# Altium footprint library 7.Connectors&Battary_holders.PcbLib: 133 footprints (part 3 of 9)
Each footprint in its own frame and in the unit in brackets; x right, y up, seen from the top. Pads: shape width x height; smd on the part's side, far side on the other; paste and mask are expansions set on the pad; w line width, h text height; cw(c..) or ccw(c..) is an arc to the next point about the centre after c.
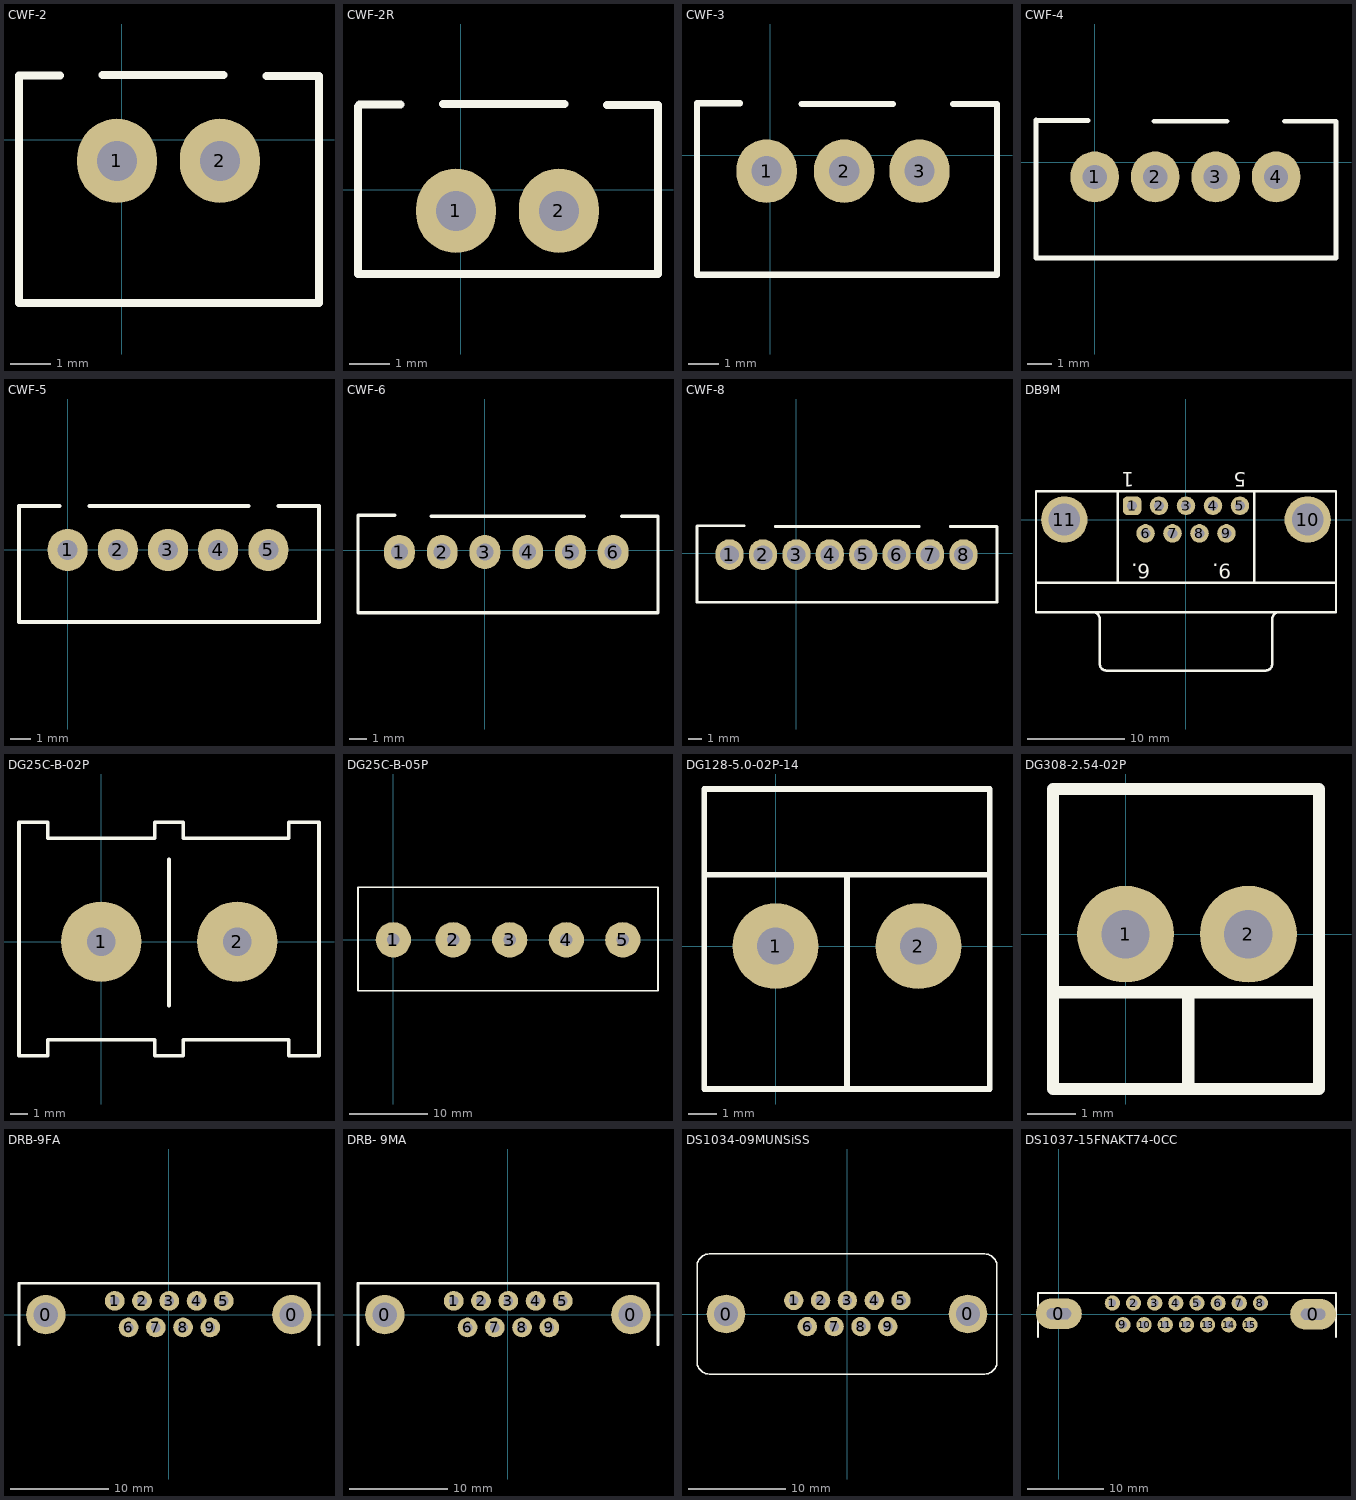
[diagram p2: the footprints below, top view; thin cyan lines are the x and y axes]

## CWF-2 [mm]
pads (2):
  oval 2x2.1 hole 1: 1(-0.123,-0.52) 2(2.445,-0.52)
Top Overlay:
  lines w0.2: -1.544,1.61 -2.569,1.61 -2.569,-4.07 4.918,-4.07 4.918,1.601 3.609,1.601 ; -0.485,1.623 2.54,1.623
3D body "User Library-DS1069-2 CWF-2.step": height 7, standoff -3.5, extent -2.582,-4.144 4.918,1.606

## CWF-2R [mm]
pads (2):
  oval 2x2.1 hole 1: 1(-0.123,-0.52) 2(2.445,-0.52)
Top Overlay:
  lines w0.2: -1.502,2.13 -2.528,2.13 -2.569,2.089 -2.569,-2.095 4.918,-2.095 4.918,2.121 3.651,2.121 ; -0.444,2.143 2.581,2.143
3D body "User Library-DS1069-2 MR (CWF-2 R).STEP": height 5.85, standoff -3.3, extent -2.485,-0.805 4.915,6.835

## CWF-3 [mm]
pads (3):
  oval 2x2.1 hole 1: 1(-0.123,-0.52) 2(2.445,-0.52) 3(4.936,-0.52)
Top Overlay:
  lines w0.2: -1.006,1.725 -2.422,1.725 -2.425,1.721 -2.425,-3.95 7.5,-3.95 7.5,1.7 6.04,1.7 ; 1.035,1.694 4.06,1.694
3D body "User Library-CWF-3.step": height 7, standoff -3.5, extent -2.567,-4.036 7.433,1.714

## CWF-4 [mm]
pads (4):
  oval 2x2.1 hole 1: 1(0,-0.6) 2(2.5,-0.6) 3(5,-0.6) 4(7.5,-0.6)
Top Overlay:
  lines w0.2: -2.425,1.75 -2.425,-3.95 9.975,-3.95 9.975,1.65 ; -2.4,1.725 -0.275,1.725 ; 2.45,1.7 5.475,1.7 ; 7.85,1.7 9.975,1.7
3D body "User Library-CWF-4.step": height 7, standoff -3.5, extent -2.3,-4.175 10.1,1.575

## CWF-5 [mm]
pads (5):
  oval 2x2.1 hole 1: 1(0,0) 2(2.5,0) 3(5,0) 4(7.5,0) 5(10,0)
Top Overlay:
  lines w0.2: -0.4,2.2 -2.425,2.2 -2.425,-3.6 12.525,-3.6 12.525,2.2 10.5,2.2 ; 1.1,2.2 9,2.2
3D body "User Library-CWF-5.step": height 7, standoff -3.5, extent -2.5,-3.55 12.5,2.2

## CWF-6 [mm]
pads (6):
  oval 1.8x2 hole 1: 1(-5,-0.1) 2(-2.5,-0.1) 3(0,-0.1) 4(2.5,-0.1) 5(5,-0.1) 6(7.5,-0.1)
Top Overlay:
  lines w0.2: -7.425,2.025 -7.425,-3.65 10.125,-3.65 10.125,1.95 ; -7.4,2.05 -5.275,2.05 ; -3.15,2 5.825,2 ; 8,2 10.125,2
3D body "User Library-CWF-6.step": height 3.5, standoff -7, extent -7.35,-3.775 10.15,1.975

## CWF-8 [mm]
pads (8):
  oval 2.1x2.3 hole 1.4: 1(-5,-0.1) 2(-2.5,-0.1) 3(0,-0.1) 4(2.5,-0.1) 5(5,-0.1) 6(7.5,-0.1) 7(10,-0.1) 8(12.5,-0.1)
Top Overlay:
  lines w0.2: -7.425,2.025 -7.425,-3.65 15,-3.65 15,2 11.5,2 ; -7.4,2.05 -3.9,2.05 ; -1.575,2 9.2,2
3D body "User Library-CWF-8.step": height 2.5, standoff -8, extent -7.55,-3.65 14.95,2.1

## DB9M [mm] "Connector; D Subminiature; 9 Position; Right Angle; Pitch 1.385 mm"
height 12.75
pads (11):
  rrect50% 1.905x1.905 hole 1: 1(-5.54,1.42)
  round 1.905 hole 1: 2(-2.77,1.42) 3(0,1.42) 4(2.77,1.42) 5(5.54,1.42) 6(-4.155,-1.42) 7(-1.385,-1.42) 8(1.385,-1.42) 9(4.155,-1.42)
  round 4.76 hole 3.26: 10(12.495,0) 11(-12.495,0)
Top Overlay:
  lines w0.254: -15.4,-6.5 15.4,-6.5 ; -9.56,-9.505 cw(c-9.56,-10.2) -8.865,-10.2 -8.865,-14.8 ; -8.86,-14.805 ccw(c-8.165,-14.805) -8.165,-15.5 8.165,-15.5 ccw(c8.165,-14.805) 8.86,-14.805 ; -7,-6.5 -7,2.9 ; 7,-6.5 7,2.9 ; 8.865,-14.8 8.865,-10.2 cw(c9.56,-10.2) 9.56,-9.505 ; -15.4,-9.5 -15.4,2.9 15.4,2.9 15.4,-9.5 -15.4,-9.5
  text "5" at 6.171,4.875 h1.5
  text "1" at -5.294,4.875 h1.5
  text "6." at -3.655,-4.525 h1.5
  text "9." at 4.655,-4.525 h1.5
3D body "D-SUB9 Male.STEP": height 12.57, standoff -3.15, extent -15.469,-16.231 15.418,3.454

## DG25C-B-02P [mm]
pads (2):
  round 4.5 hole 1.6: 1(0,0) 2(7.62,0)
Top Overlay:
  lines w0.2: 3.8,-3.6 3.8,4.6 ; -4.6,-6.4 -4.6,6.7 -3,6.7 -3,5.8 3,5.8 3,6.7 4.6,6.7 4.6,5.8 10.5,5.8 10.5,6.7 12.2,6.7 12.2,-6.4 10.5,-6.4 10.5,-5.5 4.6,-5.5 4.6,-6.4 3,-6.4 3,-5.5 -3,-5.5 -3,-6.4 -4.6,-6.4
3D body "User Library-DG25C-1.STEP": height 15, standoff -4.59, extent -4.57,-6.484 12.17,6.75

## DG25C-B-05P [mm]
pads (5):
  round 4.5 hole 1.6: 1(0,0) 2(7.62,0) 3(14.82,0) 4(22.02,0) 5(29.22,0)
Top Overlay:
  lines w0.2: -4.5,-6.5 33.7,-6.5 33.7,6.7 -4.5,6.7 -4.5,-6.5
3D body "User Library-DG25C-1.STEP": height 15, standoff -4.59, extent -4.57,-6.484 12.17,6.75
3D body "User Library-DG25C-1.STEP": height 15, standoff -4.59, extent 17.03,-6.484 33.77,6.75
3D body "User Library-DG25C-1.STEP": height 15, standoff -4.59, extent 9.83,-6.484 26.57,6.75

## DG128-5.0-02P-14 [mm]
pads (2):
  round 3 hole 1.3: 1(0,0) 2(5,0)
Top Overlay:
  lines w0.2: -2.5,2.5 7.5,2.5 ; 2.5,-5 2.5,2.5 ; 5.5,5.5 7.5,5.5 ; 7.5,5.5 -2.5,5.5 -2.5,-5 7.5,-5 7.5,5.5
3D body "User Library-klema-5mm-2pin.step": height 14, standoff -4, extent -2.5,-5 7.5,5.5

## DG308-2.54-02P [mm]
pads (2):
  round 2 hole 1: 1(0,0) 2(2.54,0)
Top Overlay:
  lines w0.254: -1.5,-1.2 4,-1.2 ; 1.295,-3.15 1.295,-1.219 ; -1.5,-3.2 4,-3.2 4,3 -1.5,3 -1.5,-3.2
3D body "User Library-DG308-2.step": height 7.93, standoff -3.9, extent -1.65,-2.997 4.15,3.025

## DRB-9FA [mm]
pads (11):
  round 4 hole 2.5: 0(-12.5,0) 0(12.5,0)
  round 2 hole 1: 1(-5.5,1.4) 2(-2.73,1.4) 3(0.04,1.4) 4(2.81,1.4) 5(5.58,1.4) 6(-4.1,-1.3) 7(-1.33,-1.3) 8(1.44,-1.3) 9(4.21,-1.3)
Top Overlay:
  lines w0.254: -15.225,-3.05 -15.225,3.175 15.25,3.175 15.25,-3.05
3D body "User Library-DB-9F.step": height 12.25, standoff -4.15, extent -15.25,-13.5 15.25,3.2

## DRB- 9MA [mm]
pads (11):
  round 4 hole 2.5: 0(-12.5,0) 0(12.5,0)
  round 2 hole 1: 1(-5.5,1.4) 2(-2.73,1.4) 3(0.04,1.4) 4(2.81,1.4) 5(5.58,1.4) 6(-4.1,-1.3) 7(-1.33,-1.3) 8(1.44,-1.3) 9(4.21,-1.3)
Top Overlay:
  lines w0.254: -15.225,-3.05 -15.225,3.175 15.25,3.175 15.25,-3.05
3D body "User Library-43767.STEP": height 12.55, standoff -3.95, extent -15.4,-15.475 15.4,3.025

## DS1034-09MUNSiSS [mm]
pads (11):
  round 4 hole 2.5: 0(-12.5,0) 0(12.5,0)
  round 2 hole 1: 1(-5.5,1.4) 2(-2.73,1.4) 3(0.04,1.4) 4(2.81,1.4) 5(5.58,1.4) 6(-4.1,-1.3) 7(-1.33,-1.3) 8(1.44,-1.3) 9(4.21,-1.3)
Top Overlay:
  lines w0.15: -15.5,-4.93 ccw(c-14.23,-4.93) -14.23,-6.2 14.23,-6.2 ccw(c14.23,-4.93) 15.5,-4.93 15.5,4.93 ccw(c14.23,4.93) 14.23,6.2 -14.23,6.2 ccw(c-14.23,4.93) -15.5,4.93 -15.5,-4 -15.5,-4.93
3D body "User Library-DB9-PCB Solder-male.step": height 14.17, standoff -2.73, extent -15.499,-6.2 15.499,6.2

## DS1037-15FNAKT74-0CC [mm]
pads (17):
  oval 6x4 hole 1.5 slot 3.2 at 0 deg: 0(0.038,0.07) 0(33.32,0)
  round 2 hole 1: 1(7.038,1.47) 2(9.808,1.47) 3(12.578,1.47) 4(15.348,1.47) 5(18.118,1.47) 6(20.888,1.47) 7(23.658,1.47) 8(26.428,1.47) 9(8.423,-1.37) 10(11.193,-1.37) 11(13.963,-1.37) 12(16.733,-1.37) 13(19.503,-1.37) 14(22.273,-1.37) 15(25.043,-1.37)
Top Overlay:
  lines w0.254: -2.687,-2.98 -2.687,2.77 36.3,2.77 36.3,-2.98
3D body "User Library-DRB-15FA.step": height 12.5, standoff -4.65, extent -2.77,-15.858 36.37,2.542